# Altium footprint library 杂项开关等.PcbLib: 45 footprints (part 1 of 3)
Each footprint in its own frame and in the unit in brackets; x right, y up, seen from the top. Pads: shape width x height; smd on the part's side, far side on the other; paste and mask are expansions set on the pad; w line width, h text height; cw(c..) or ccw(c..) is an arc to the next point about the centre after c.
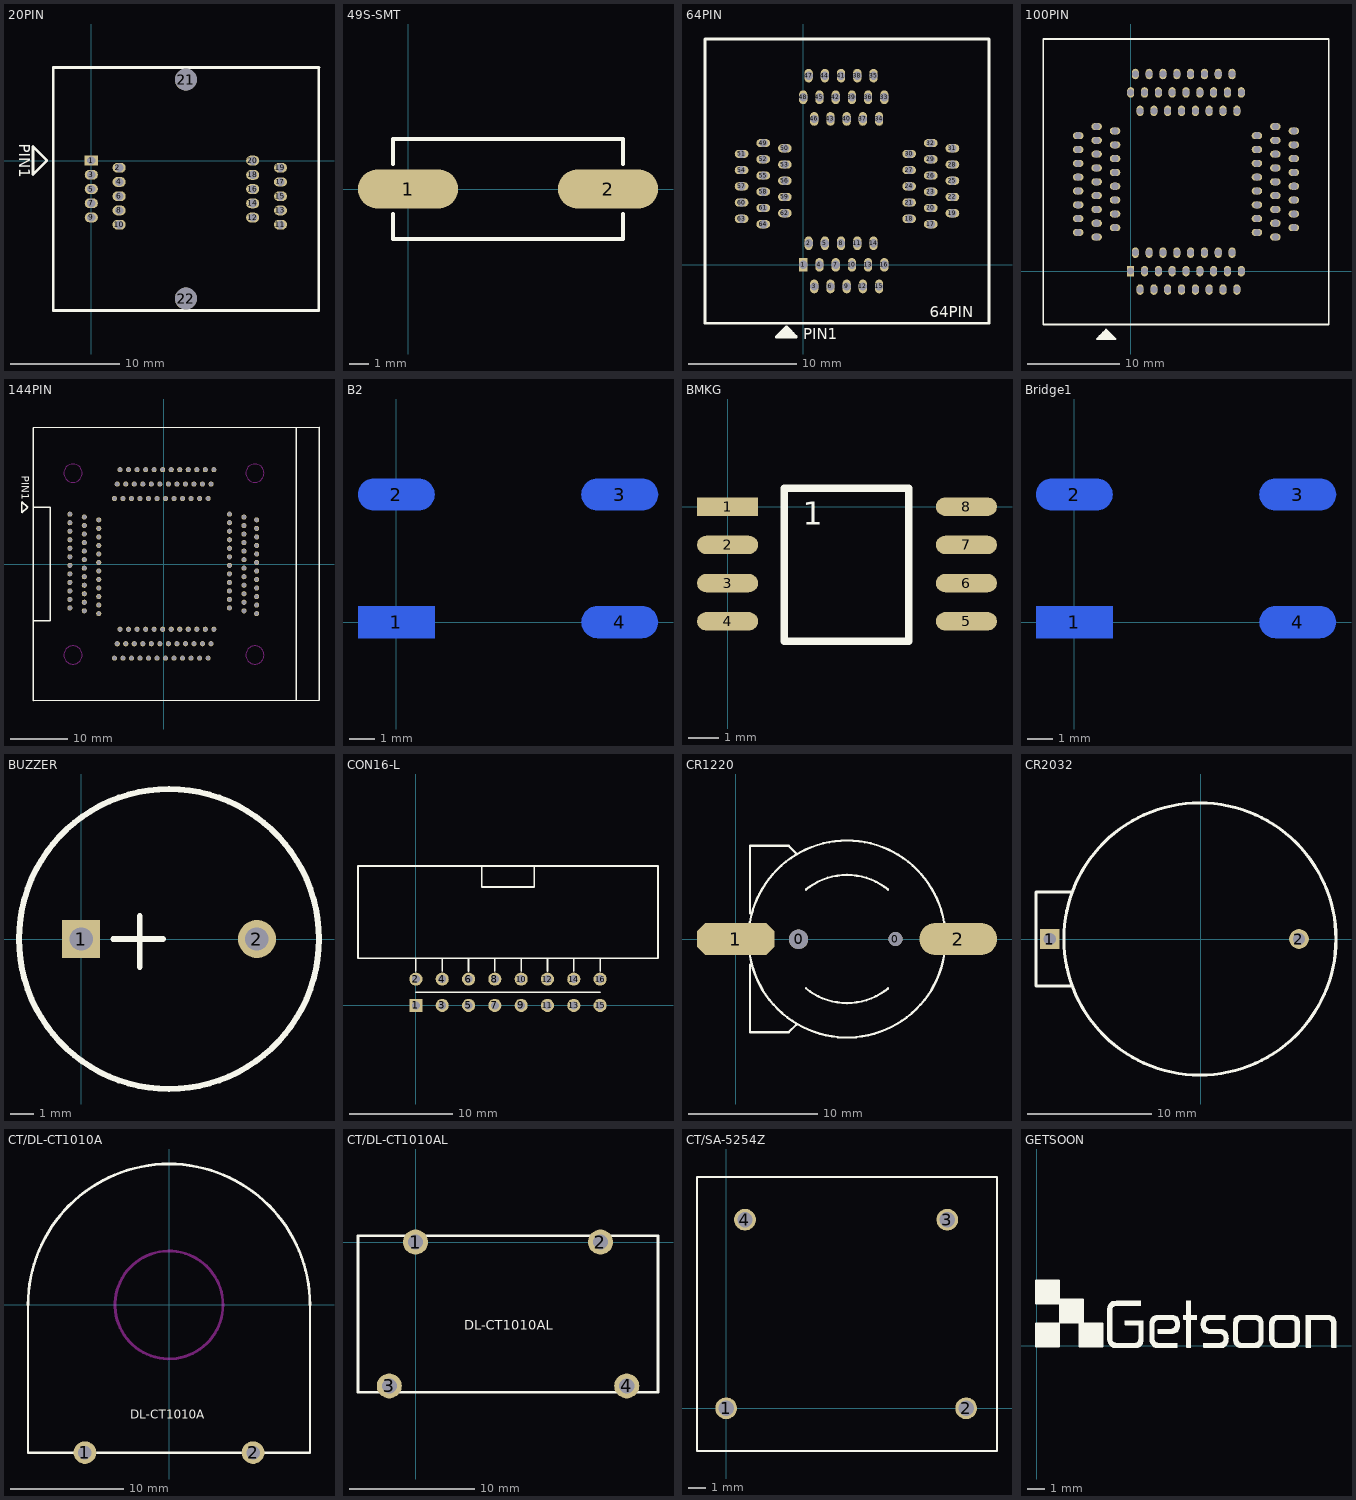
[diagram p0: the footprints below, top view; thin cyan lines are the x and y axes]

## 20PIN [mm]
pads (24):
  rect 1.2x0.9 hole 0.762: 1(0,0)
  oval 1.2x0.9 hole 0.762: "2 "(2.536,-0.66) 3(0,-1.3) 4(2.536,-1.958) 5(0,-2.6) 6(2.536,-3.258) 7(0,-3.9) 8(2.536,-4.558) 9(0,-5.2) 10(2.536,-5.858) 11(17.276,-5.858) 12(14.736,-5.208) 13(17.276,-4.558) 14(14.736,-3.908) 15(17.276,-3.258) 16(14.736,-2.608) 18(14.736,-1.308) 19(17.276,-0.658) 20(14.736,-0.008)
  oval 1.2x0.8 hole 0.762: 17(17.276,-1.958)
  round 2 hole 2: 21(8.636,7.392) 21(8.636,7.392) 22(8.636,-12.608) 22(8.636,-12.608)
Top Overlay:
  lines w0.254: -3.484,-13.698 -3.484,8.5 0,8.5 20.794,8.5 20.776,8.482 20.776,7.266 20.776,-0.658 20.776,-13.699 -3.483,-13.699 ; -5.334,-1.27 -4.064,0 -5.334,1.27 -5.334,-1.27
  text "PIN1" at -6.604,1.524 h1.02

## 49S-SMT [mm]
pads (2):
  oval 5.08x2 smd: 1(0,0) 2(10.16,0)
Top Overlay:
  lines w0.203: -0.762,-1.27 -0.762,-2.54 10.922,-2.54 10.922,-1.27 ; -0.762,1.27 -0.762,2.54 10.922,2.54 10.922,1.27

## 64PIN [mil]
pads (64):
  rect 30x50 hole 30: 1(0,0)
  oval 30x50 hole 30: 2(19.68,78.74) 3(40,-78.74) 4(59.06,0) 5(78.74,78.74) 6(99.06,-78.74) 7(118.11,0) 8(137.8,78.74) 9(158.11,-78.74) 10(177.17,0) 11(196.85,78.74) 12(217.17,-78.74) 13(236.22,0) 14(255.91,78.74) 15(276.22,-78.74) 16(295.28,0) 33(295.28,610.24) 34(276.22,531.5) 35(255.91,688.98) 36(236.22,610.24) 37(217.17,531.5) 38(196.85,688.98) 39(177.17,610.24) 40(158.11,531.5) 41(137.8,688.98) 42(118.11,610.24) 43(99.06,531.5) 44(78.74,688.98) 45(59.06,610.24) 46(40,531.5) 47(19.68,688.98) 48(0,610.24)
  oval 50x30 hole 30: 17(464.5,148.15) 18(385.76,167.83) 19(543.24,188.15) 20(464.5,207.2) 21(385.76,226.89) 22(543.24,247.2) 23(464.5,266.26) 24(385.76,285.94) 25(543.24,306.26) 26(464.5,325.31) 27(385.76,345) 28(543.24,365.31) 29(464.5,384.37) 30(385.76,404.06) 31(543.24,424.37) 32(464.5,443.43) 49(-145.74,443.43) 50(-67,424.37) 51(-224.48,404.06) 52(-145.74,384.37) 53(-67,365.31) 54(-224.48,345) 55(-145.74,325.31) 56(-67,306.26) 57(-224.48,285.94) 58(-145.74,266.26) 59(-67,247.2) 60(-224.48,226.89) 61(-145.74,207.2) 62(-67,188.15) 63(-224.48,167.83) 64(-145.74,148.15)
Top Overlay:
  lines w10: -89.12,-253.86 -37.53,-253.86 ; -84.4,-249.14 -37.01,-249.14 ; -77.72,-242.46 -43.7,-242.46 ; -69.7,-234.44 -51.71,-234.44 ; -60.71,-227.45 -60.71,-225.45 ; -25.71,-263.45 -98.71,-263.45 -60.71,-225.45 ; -25.71,-260.45 -60.71,-225.45 ; -358,-212.26 40,-212.26 676.76,-212.26 676.76,423.26 676.76,822.5 20.68,822.5 -358,822.5 -358,403.26 -358,-212.26
  text "PIN1" at 0,-270 h40
  text "64PIN" at 460,-190 h40

## 100PIN [mil]
pads (100):
  rect 30x45 hole 30: 1(0,0)
  oval 30x45 hole 30: 2(19.69,78.74) 3(40,-78.74) 4(59.06,0) 5(78.74,78.74) 6(99.06,-78.74) 7(118.11,0) 8(137.8,78.74) 9(158.11,-78.74) 10(177.17,0) 11(196.85,78.74) 12(217.17,-78.74) 13(236.22,0) 14(255.91,78.74) 15(276.22,-78.74) 16(295.28,0) 17(314.96,78.74) 18(335.28,-78.74) 19(354.33,0) 20(374.02,78.74) 21(394.33,-78.74) 22(413.39,0) 23(433.07,78.74) 24(453.39,-78.74) 25(472.44,0) 51(472.44,763.78) 52(453.39,685.04) 53(433.07,842.52) 54(413.39,763.78) 55(394.33,685.04) 56(374.02,842.52) 57(354.33,763.78) 58(335.28,685.04) 59(314.96,842.52) 60(295.28,763.78) 61(276.22,685.04) 62(255.91,842.52) 63(236.22,763.78) 64(217.16,685.04) 65(196.85,842.52) 66(177.16,763.78) 67(158.11,685.04) 68(137.79,842.52) 69(118.11,763.78) 70(99.05,685.04) 71(78.74,842.52) 72(59.05,763.78) 73(40,685.04) 74(19.68,842.52) 75(0,763.78)
  oval 45x30 hole 30: 26(618.11,145.67) 27(539.37,165.35) 28(696.85,185.67) 29(618.11,204.72) 30(539.37,224.41) 31(696.85,244.72) 32(618.11,263.78) 33(539.37,283.46) 34(696.85,303.78) 35(618.11,322.83) 36(539.37,342.52) 37(696.85,362.83) 38(618.11,381.89) 39(539.37,401.57) 40(696.85,421.89) 41(618.11,440.94) 42(539.37,460.63) 43(696.85,480.94) 44(618.11,500) 45(539.37,519.69) 46(696.85,540) 47(618.11,559.06) 48(539.37,578.74) 49(696.85,599.06) 50(618.11,618.11) 76(-145.67,618.11) 77(-66.93,599.06) 78(-224.41,578.74) 79(-145.67,559.06) 80(-66.93,540) 81(-224.41,519.69) 82(-145.67,500) 83(-66.93,480.94) 84(-224.41,460.63) 85(-145.67,440.94) 86(-66.93,421.89) 87(-224.41,401.57) 88(-145.67,381.89) 89(-66.93,362.83) 90(-224.41,342.52) 91(-145.67,322.83) 92(-66.93,303.78) 93(-224.41,283.46) 94(-145.67,263.78) 95(-66.93,244.72) 96(-224.41,224.41) 97(-145.67,204.72) 98(-66.93,185.67) 99(-224.41,165.35) 100(-145.67,145.67)
Top Overlay:
  lines w8: -140.21,-285.21 -69.79,-285.21 ; -132.88,-277.88 -77.12,-277.88 ; -125.28,-270.28 -84.72,-270.28 ; -118.01,-263.01 -91.99,-263.01 ; -105,-290 -65,-290 -105,-250 ; -105,-290 -145,-290 -105,-250 ; -105,-290 -105,-250 ; -374.02,-228.35 -374.02,992.13 846.46,992.13 846.46,-228.35 -374.02,-228.35

## 144PIN [mm]
pads (144):
  round 0.9 hole 0.7: 1(-16.551,8.779) 2(-14.011,8.279) 3(-11.471,7.779) 4(-16.551,7.279) 5(-14.011,6.779) 6(-11.471,6.279) 7(-16.551,5.779) 8(-14.011,5.279) 9(-11.471,4.779) 10(-16.551,4.279) 11(-14.011,3.779) 12(-11.471,3.279) 13(-16.551,2.779) 14(-14.011,2.279) 15(-11.471,1.779) 16(-16.551,1.279) 17(-14.011,0.779) 18(-11.471,0.279) 19(-16.551,-0.221) 20(-14.011,-0.721) 21(-11.471,-1.221) 22(-16.551,-1.721) 23(-14.011,-2.221) 24(-11.471,-2.721) 25(-16.551,-3.221) 26(-14.011,-3.721) 27(-11.471,-4.221) 28(-16.551,-4.721) 29(-14.011,-5.221) 30(-11.471,-5.721) 31(-16.551,-6.221) 32(-14.011,-6.721) 33(-11.471,-7.221) 34(-16.551,-7.721) 35(-14.011,-8.221) 36(-11.471,-8.721) 37(-8.721,-16.551) 38(-8.221,-14.011) 39(-7.721,-11.471) 40(-7.221,-16.551) 41(-6.721,-14.011) 42(-6.221,-11.471) 43(-5.721,-16.551) 44(-5.221,-14.011) 45(-4.721,-11.471) 46(-4.221,-16.551) 47(-3.721,-14.011) 48(-3.221,-11.471) 49(-2.721,-16.551) 50(-2.221,-14.011) 51(-1.721,-11.471) 52(-1.221,-16.551) 53(-0.721,-14.011) 54(-0.221,-11.471) 55(0.279,-16.551) 56(0.779,-14.011) 57(1.279,-11.471) 58(1.779,-16.551) 59(2.279,-14.011) 60(2.779,-11.471) 61(3.279,-16.551) 62(3.779,-14.011) 63(4.279,-11.471) 64(4.779,-16.551) 65(5.279,-14.011) 66(5.779,-11.471) 67(6.279,-16.551) 68(6.779,-14.011) 69(7.279,-11.471) 70(7.779,-16.551) 71(8.279,-14.011) 72(8.779,-11.471) 73(16.309,-8.721) 74(14.069,-8.221) 75(11.529,-7.721) 76(16.309,-7.221) 77(14.069,-6.721) 78(11.529,-6.221) 79(16.309,-5.721) 80(14.069,-5.221) 81(11.529,-4.721) 82(16.309,-4.221) 83(14.069,-3.721) 84(11.529,-3.221) 85(16.309,-2.721) 86(14.069,-2.221) 87(11.529,-1.721) 88(16.309,-1.221) 89(14.069,-0.721) 90(11.529,-0.221) 91(16.309,0.279) 92(14.069,0.779) 93(11.529,1.279) 94(16.309,1.779) 95(14.069,2.279) 96(11.529,2.779) 97(16.309,3.279) 98(14.069,3.779) 99(11.529,4.279) 100(16.309,4.779) 101(14.069,5.279) 102(11.529,5.779) 103(16.309,6.279) 104(14.069,6.779) 105(11.529,7.279) 106(16.309,7.779) 107(14.069,8.279) 108(11.529,8.779) 109(8.779,16.609) 110(8.279,14.069) 111(7.779,11.529) 112(7.279,16.609) 113(6.779,14.069) 114(6.279,11.529) 115(5.779,16.609) 116(5.279,14.069) 117(4.779,11.529) 118(4.279,16.609) 119(3.779,14.069) 120(3.279,11.529) 121(2.779,16.609) 122(2.279,14.069) 123(1.779,11.529) 124(1.279,16.609) 125(0.779,14.069) 126(0.279,11.529) 127(-0.221,16.609) 128(-0.721,14.069) 129(-1.221,11.529) 130(-1.721,16.609) 131(-2.221,14.069) 132(-2.721,11.529) 133(-3.221,16.609) 134(-3.721,14.069) 135(-4.221,11.529) 136(-4.721,16.609) 137(-5.221,14.069) 138(-5.721,11.529) 139(-6.221,16.609) 140(-6.721,14.069) 141(-7.221,11.529) 142(-7.721,16.609) 143(-8.221,14.069) 144(-8.721,11.529)
Top Overlay:
  lines w0.254: -23,-10 -20,-10 -20,10 -23,10 ; 23.251,24.027 23.251,-23.973 ; 23.251,-23.973 23.252,-23.973 ; -25,9 -25,11 -24,10 -25,9 ; -23,-24 27.279,-23.971 27.279,24.029 -23,24 -23,-24
  text "PIN1" at -25.5,15.5 h2.29
Keep-Out Layer:
  circle w0.152: c-16,16 r1.6
  circle w0.152: c16.004,16 r1.6
  circle w0.152: c-16,-16.004 r1.6
  circle w0.152: c16.004,-16.004 r1.6

## B2 [mil]
pads (4):
  rect 120x50 smd far side: 1(0,0)
  oval 120x50 smd far side: 2(0,200) 3(350,200) 4(350,0)
Bottom Overlay:
  circle w23.62: c1.97,-65.94 r11.81
  lines w10: 70,-60 280,-60 280,260 70,260 70,-60

## BMKG [mil]
pads (8):
  rect 80x24 smd: 1(0,0)
  oval 80x24 smd: 2(0,-50) 3(0,-100) 4(0,-150) 5(312.6,-150) 6(312.6,-100) 7(312.6,-50) 8(312.6,0)
Top Overlay:
  lines w10: 182,23.94 74.39,23.94 74.39,-176.06 237.01,-176.06 ; 182,24 237.01,24 ; 236.01,23 237.01,24 ; 237.01,-176 237.01,24
  text "1" at 98.43,-23.62 h30

## Bridge1 [mil]
pads (4):
  rect 120x50 smd far side: 1(0,0)
  oval 120x50 smd far side: 2(0,200) 3(350,200) 4(350,0)
Bottom Overlay:
  circle w23.62: c1.97,-65.94 r11.81
  lines w10: 70,-60 70,260 280,260 280,-60 70,-60

## BUZZER [mil]
pads (2):
  rect 65x65 hole 40: 1(0,0)
  round 65 hole 40: 2(300,0)
Top Overlay:
  circle w10: c150,0 r255.91
  lines w10: 55,0 140,0 ; 100,-48 100,39

## CON16-L [mil]
pads (16):
  rect 50x50 hole 30: 1(0,0)
  round 50 hole 30: 2(0,100) 3(100,0) 4(100,100) 5(200,0) 6(200,100) 7(300,0) 8(300,100) 9(400,0) 10(400,100) 11(500,0) 12(500,100) 13(600,0) 14(600,100) 15(700,0) 16(700,100)
Top Overlay:
  lines w6: 0,50 700,50 ; 0,130 0,140 0,180 ; 100,130 100,180 ; 200,130 200,180 ; 250,530 250,450 450,450 450,530 ; 300,130 300,180 ; 400,130 400,180 ; 500,130 500,180 ; 600,130 600,180 ; 700,130 700,180 ; -220,180 -220,530 920,530 920,180 -220,180

## CR1220 [mm]
pads (4):
  round 1.5 hole 1.5 unplated: 0(4.85,-0.025)
  round 1.1 hole 1.1 unplated: 0(12.35,0)
  oct 6x2.5 smd: 1(0,0)
  oval 6x2.5 smd: 2(17.2,0)
Top Overlay:
  lines w0.178: 1.026,-0.833 ccw(c8.6,0) 16.174,-0.833 ; 1.026,0.833 cw(c8.6,0) 8.6,7.62 cw(c8.6,0) 16.174,0.833 ; 1.1,-2 1.1,-7.2 4.1,-7.2 4.675,-6.625 ; 1.1,2 1.1,7.2 4.1,7.2 4.7,6.6 ; 5.425,-3.81 ccw(c8.6,0) 11.772,-3.812 ; 5.431,3.815 cw(c8.6,0) 11.772,3.812

## CR2032 [mm]
pads (2):
  rect 1.6x1.6 hole 1: 1(-12.192,0)
  round 1.6 hole 1: 2(7.954,0)
Top Overlay:
  circle w0.254: c-0.05,0 r11
  lines w0.254: -10.5,-3.8 -13.3,-3.8 -13.3,3.8 -10.5,3.8

## CT/DL-CT1010A [mm]
pads (2):
  round 2 hole 1.2: 1(-7.4,-13) 2(7.4,-13)
Top Overlay:
  lines w0.203: -12.4,0 -12.4,-13 0,-13 12.4,-13 12.4,0
  lines w0.254: -12.4,0 cw(c0,0) 12.4,0
  text "DL-CT1010A" at -3.4,-10 h0.76
Keep-Out Layer:
  circle w0.254: c0,0 r4.75

## CT/DL-CT1010AL [mm]
pads (4):
  round 2 hole 1.2: 1(0,0) 2(14.8,0) 3(-2.1,-11.5) 4(16.9,-11.5)
Top Overlay:
  lines w0.203: -2.1,-12 7.4,-12 16.4,-12 16.9,-11.5 17.4,-12 19.4,-12 19.4,0.5 -4.6,0.5 -4.6,-12 -2.6,-12 -2.1,-11.5
  text "DL-CT1010AL" at 3.9,-7 h0.76

## CT/SA-5254Z [mm]
pads (4):
  round 1.27 hole 0.889: 1(0,0) 2(14,0) 3(12.9,11) 4(1.1,11)
Top Overlay:
  lines w0.127: -1.7,-2.5 -1.7,13.5 15.8,13.5 15.8,-2.5 -1.7,-2.5

## GETSOON [mm]
Top Overlay:
  drawing of 1672 lines, arcs and shapes, not listed